# Altium footprint library MyPcbLib.PcbLib: 657 footprints (part 41 of 42)
Each footprint in its own frame and in the unit in brackets; x right, y up, seen from the top. Pads: shape width x height; smd on the part's side, far side on the other; paste and mask are expansions set on the pad; w line width, h text height; cw(c..) or ccw(c..) is an arc to the next point about the centre after c.
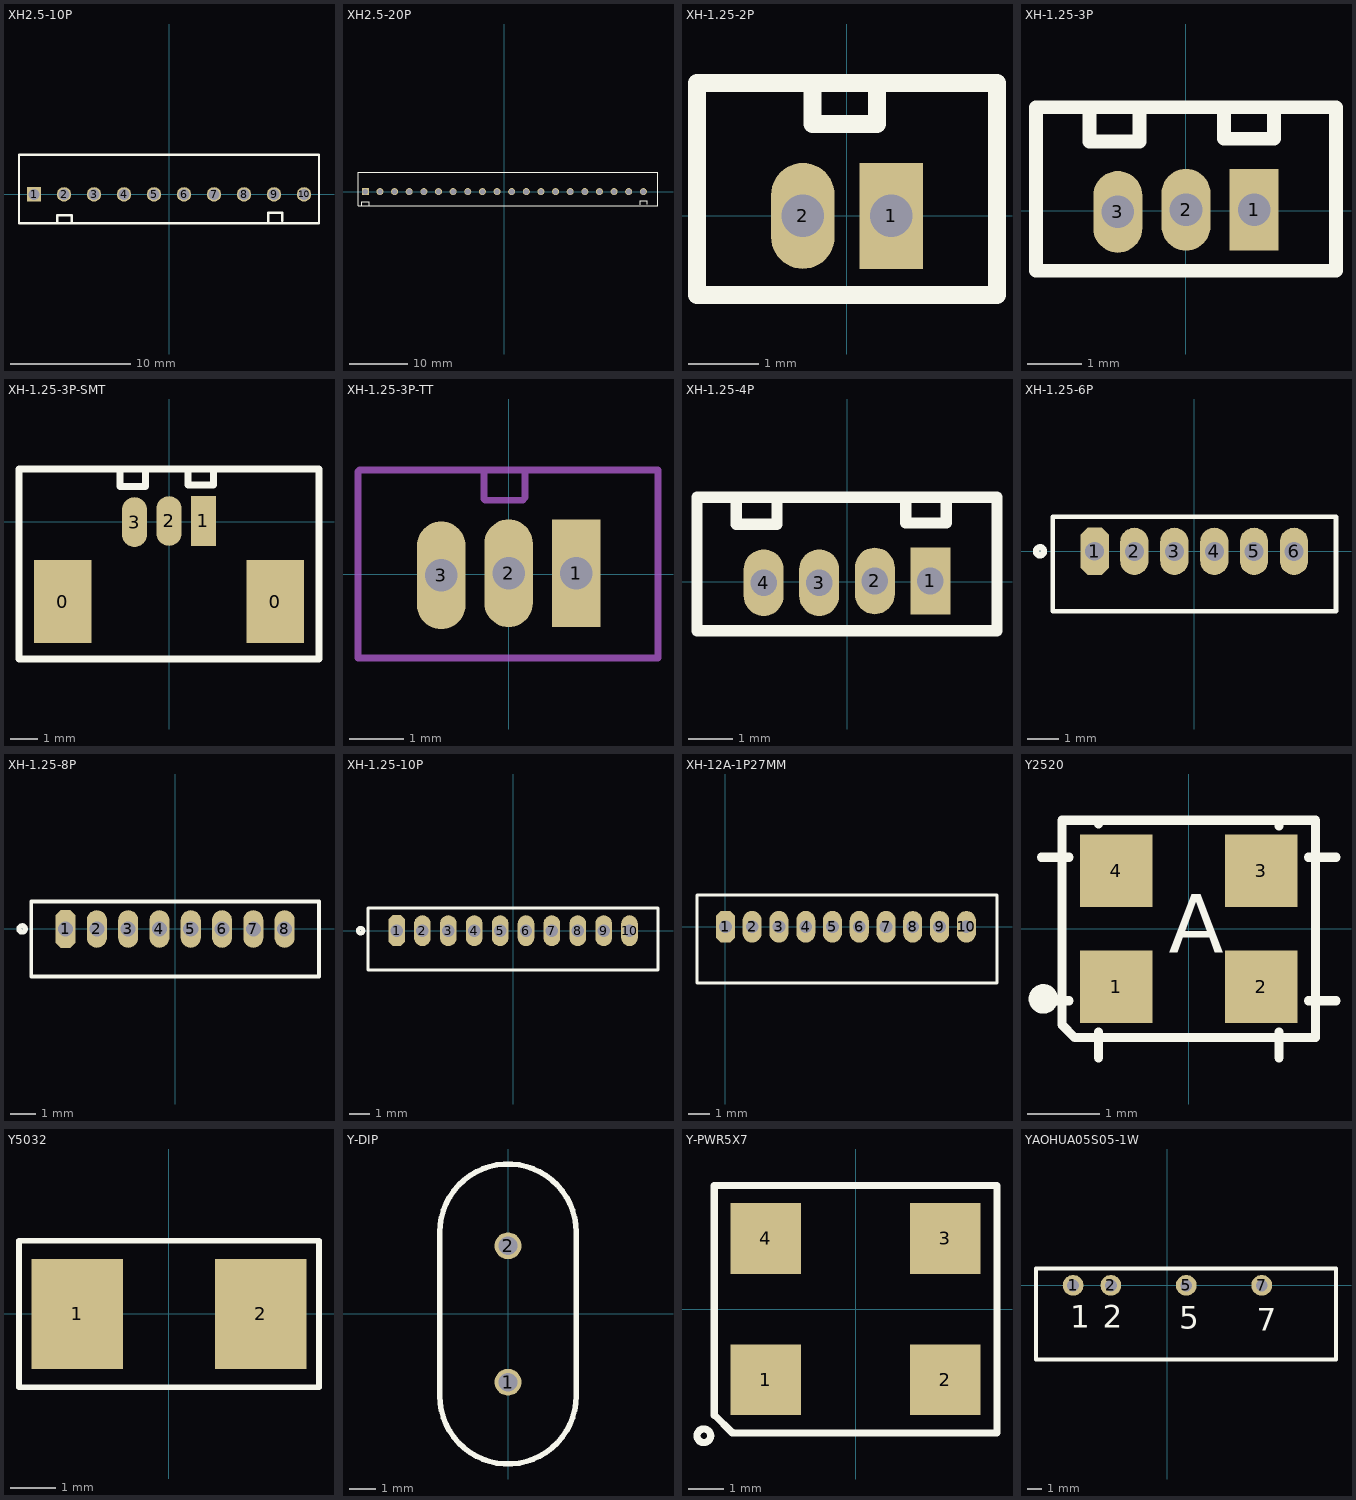
[diagram p40: the footprints below, top view; thin cyan lines are the x and y axes]

## XH2.5-10P [mm]
pads (10):
  rect 1.2x1.2 hole 0.9: 1(-11.25,0)
  round 1.2 hole 0.9: 2(-8.75,0) 3(-6.25,0) 4(-3.75,0) 5(-1.25,0) 6(1.25,0) 7(3.75,0) 8(6.25,0) 9(8.75,0) 10(11.25,0)
Top Overlay:
  lines w0.203: -9.323,-2.311 -9.323,-1.727 -8.104,-1.727 -8.104,-2.286 ; 8.253,-2.235 8.253,-1.524 9.447,-1.524 9.447,-2.184 ; -12.5,-2.4 -12.5,3.302 12.5,3.302 12.5,-2.4 -12.5,-2.4

## XH2.5-20P [mm]
pads (20):
  rect 1.2x1.2 hole 0.9: 1(-23.75,0)
  round 1.2 hole 0.9: 2(-21.25,0) 3(-18.75,0) 4(-16.25,0) 5(-13.75,0) 6(-11.25,0) 7(-8.75,0) 8(-6.25,0) 9(-3.75,0) 10(-1.25,0) 11(1.25,0) 12(3.75,0) 13(6.25,0) 14(8.75,0) 15(11.25,0) 16(13.75,0) 17(16.25,0) 18(18.75,0) 19(21.25,0) 20(23.75,0)
Top Overlay:
  lines w0.203: -24.323,-2.311 -24.323,-1.727 -23.104,-1.727 -23.104,-2.286 ; 23.253,-2.235 23.253,-1.524 24.447,-1.524 24.447,-2.184 ; -25,-2.4 -25,3.302 26.25,3.302 26.25,-2.4 -25,-2.4

## XH-1.25-2P [mm]
pads (2):
  rect 0.9x1.5 hole 0.6: 1(0.625,0)
  oval 0.9x1.5 hole 0.6: 2(-0.625,0)
Top Overlay:
  lines w0.254: -0.488,1.861 -0.488,1.302 0.426,1.302 0.426,1.81 ; -2.125,-1.119 -2.125,1.881 2.125,1.881 2.125,-1.119 -2.125,-1.119

## XH-1.25-3P [mm]
pads (3):
  rect 0.9x1.5 hole 0.6: 1(1.25,0.019)
  oval 0.9x1.5 hole 0.6: 2(0,0.019) 3(-1.25,-0.019)
Top Overlay:
  lines w0.254: -1.768,1.829 -1.768,1.27 -0.854,1.27 -0.854,1.778 ; 0.696,1.88 0.696,1.321 1.61,1.321 1.61,1.829 ; -2.75,-1.1 -2.75,1.9 2.75,1.9 2.75,-1.1 -2.75,-1.1

## XH-1.25-3P-SMT [mm]
pads (5):
  rect 2.1x3 smd: 0(-3.85,-2.9) 0(3.85,-2.9)
  rect 0.9x1.8 smd: 1(1.25,0.019)
  oval 0.9x1.8 smd: 2(0,0.019) 3(-1.25,-0.019)
Top Overlay:
  lines w0.254: -1.768,1.829 -1.768,1.27 -0.854,1.27 -0.854,1.778 ; 0.696,1.88 0.696,1.321 1.61,1.321 1.61,1.829 ; -5.436,-4.978 -5.436,1.9 5.436,1.9 5.436,-4.978 -5.436,-4.978

## XH-1.25-3P-TT [mm]
pads (3):
  rect 0.9x2 hole 0.6: 1(1.25,0.019)
  oval 0.9x2 hole 0.6: 2(0,0.019) 3(-1.25,-0.019)
Mechanical 15:
  lines w0.127: -2.794,1.905 -2.794,-1.549 2.769,-1.549 2.769,1.93 -2.769,1.93 ; -0.457,1.854 -0.457,1.397 -0.432,1.372 0.254,1.372 0.305,1.422 0.305,1.905 0.279,1.93

## XH-1.25-4P [mm]
pads (4):
  rect 0.9x1.5 hole 0.6: 1(1.875,0.019)
  oval 0.9x1.5 hole 0.6: 2(0.625,0.019) 3(-0.625,-0.019) 4(-1.875,-0.019)
Top Overlay:
  lines w0.254: -2.489,1.854 -2.489,1.295 -1.575,1.295 -1.575,1.803 ; 1.321,1.88 1.321,1.321 2.235,1.321 2.235,1.829 ; -3.375,-1.1 3.375,-1.1 3.375,1.9 -3.375,1.9 -3.375,-1.1

## XH-1.25-6P [mm]
pads (6):
  oct 0.9x1.5 hole 0.6: 1(-3.166,0.001)
  oval 0.9x1.5 hole 0.6: 2(-1.905,0) 3(-0.635,0) 4(0.635,0) 5(1.896,-0.001) 6(3.166,-0.001)
Top Overlay:
  circle w0.203: c-4.902,0 r0.127
  lines w0.15: -4.5,-1.899 -4.5,1.101
  lines w0.152: -4.5,-1.899 4.5,-1.902 ; -4.5,1.101 4.5,1.101 ; 4.5,-1.906 4.5,1.078

## XH-1.25-8P [mm]
pads (8):
  oct 0.8x1.5 hole 0.6: 1(-4.375,0)
  oval 0.8x1.5 hole 0.6: 2(-3.125,0) 3(-1.875,0) 4(-0.625,0) 5(0.625,0) 6(1.875,0) 7(3.125,0) 8(4.375,0)
Top Overlay:
  circle w0.203: c-6.111,0.001 r0.127
  lines w0.15: -5.75,-1.898 -5.75,1.102
  lines w0.152: -5.75,1.102 5.75,1.102 ; -5.709,-1.898 5.75,-1.898 ; 5.75,-1.902 5.75,1.074

## XH-1.25-10P [mm]
pads (10):
  oct 0.8x1.5 hole 0.6: 1(-5.625,0)
  oval 0.8x1.5 hole 0.6: 2(-4.375,0) 3(-3.125,0) 4(-1.875,0) 5(-0.625,0) 6(0.625,0) 7(1.875,0) 8(3.125,0) 9(4.375,0) 10(5.625,0)
Top Overlay:
  circle w0.203: c-7.361,0.001 r0.127
  lines w0.15: -7,-1.898 -7,1.102
  lines w0.152: -7,1.102 7,1.102 ; -6.959,-1.898 7,-1.898 ; 7,-1.902 7,1.074

## XH-12A-1P27MM [mm]
pads (10):
  oct 0.9x1.5 hole 0.6: 1(0,0)
  oval 0.9x1.5 hole 0.6: 2(1.261,-0.001) 3(2.531,-0.001) 4(3.801,-0.001) 5(5.063,-0.002) 6(6.333,-0.002) 7(7.603,-0.002) 8(8.864,-0.003) 9(10.134,-0.003) 10(11.404,-0.003)
Top Overlay:
  lines w0.15: -1.346,-2.666 -1.346,1.508
  lines w0.152: -1.346,-2.666 12.852,-2.668 12.852,1.489 -1.346,1.508
3D body: height 5, standoff -1.35, extent -1.234,-2.591 12.766,1.409

## Y2520 [mm] "Crystal SMD 2.5x2.0mm"
height 0.8
pads (4):
  rect 1x1 smd mask+0.05: 1(-1,-0.8) 2(1,-0.8) 3(1,0.8) 4(-1,0.8)
Top Overlay:
  circle w0.203: c-2.007,-0.965 r0.102
  lines w0.127: -2.032,-0.991 -1.651,-0.991 ; -2.032,0.991 -1.651,0.991 ; -1.245,-1.778 -1.245,-1.422 ; -1.245,1.448 -1.245,1.499 ; 1.245,-1.778 1.245,-1.422 ; 1.245,1.422 1.245,1.499 ; 1.651,-0.991 2.032,-0.991 ; 1.651,0.991 2.032,0.991 ; -1.75,-1.323 -1.573,-1.5 1.75,-1.5 1.75,1.5 -1.75,1.5 -1.75,-1.323
  text "A" at -0.279,-0.33 h0.81

## Y5032 [mm] "Crystal SMD 5.0x3.2mm"
height 1.2
pads (2):
  rect 2x2.4 smd: 1(-2,0) 2(2,0)
Top Overlay:
  lines w0.127: -3.277,-1.6 -3.277,1.6 3.277,1.6 3.277,-1.6 -3.277,-1.6

## Y-DIP [mm]
pads (2):
  round 1 hole 0.7: 1(0,-2.54) 2(0,2.54)
Top Overlay:
  lines w0.203: -2.54,-3.048 ccw(c0,-3.048) 2.54,-3.048 2.54,3.048 ccw(c0,3.048) -2.54,3.048 -2.54,-3.048
3D body: height 4.5, standoff -2, extent -2.117,-5.627 2.083,5.373

## Y-PWR5X7 [mm]
pads (4):
  rect 2x2 smd: 1(-2.54,-2) 2(2.54,-2) 3(2.54,2) 4(-2.54,2)
Top Overlay:
  circle w0.203: c-4.293,-3.581 r0.193
  lines w0.203: -4,-3 -4,3.5 4,3.5 4,-3.5 -3.5,-3.5 ; -3.988,-2.997 -3.505,-3.48 -3.48,-3.48

## YAOHUA05S05-1W [mm]
pads (4):
  round 1.4 hole 0.8: 1(-6.35,0) 2(-3.81,0) 5(1.27,0) 7(6.35,0)
Top Overlay:
  lines w0.254: -8.85,-4.999 11.35,-4.999 11.35,1.138 -8.85,1.138 -8.85,-4.999
  text "1" at -6.541,-2.843 h1.52
  text "2" at -4.343,-2.845 h1.52
  text "5" at 0.787,-2.921 h1.52
  text "7" at 6.02,-3.073 h1.52
3D body: height 11, standoff -1, extent -8.403,-5.109 11.197,0.991